# Altium footprint library my_AP_lib_pcb.PcbLib: 115 footprints (part 6 of 8)
Each footprint in its own frame and in the unit in brackets; x right, y up, seen from the top. Pads: shape width x height; smd on the part's side, far side on the other; paste and mask are expansions set on the pad; w line width, h text height; cw(c..) or ccw(c..) is an arc to the next point about the centre after c.
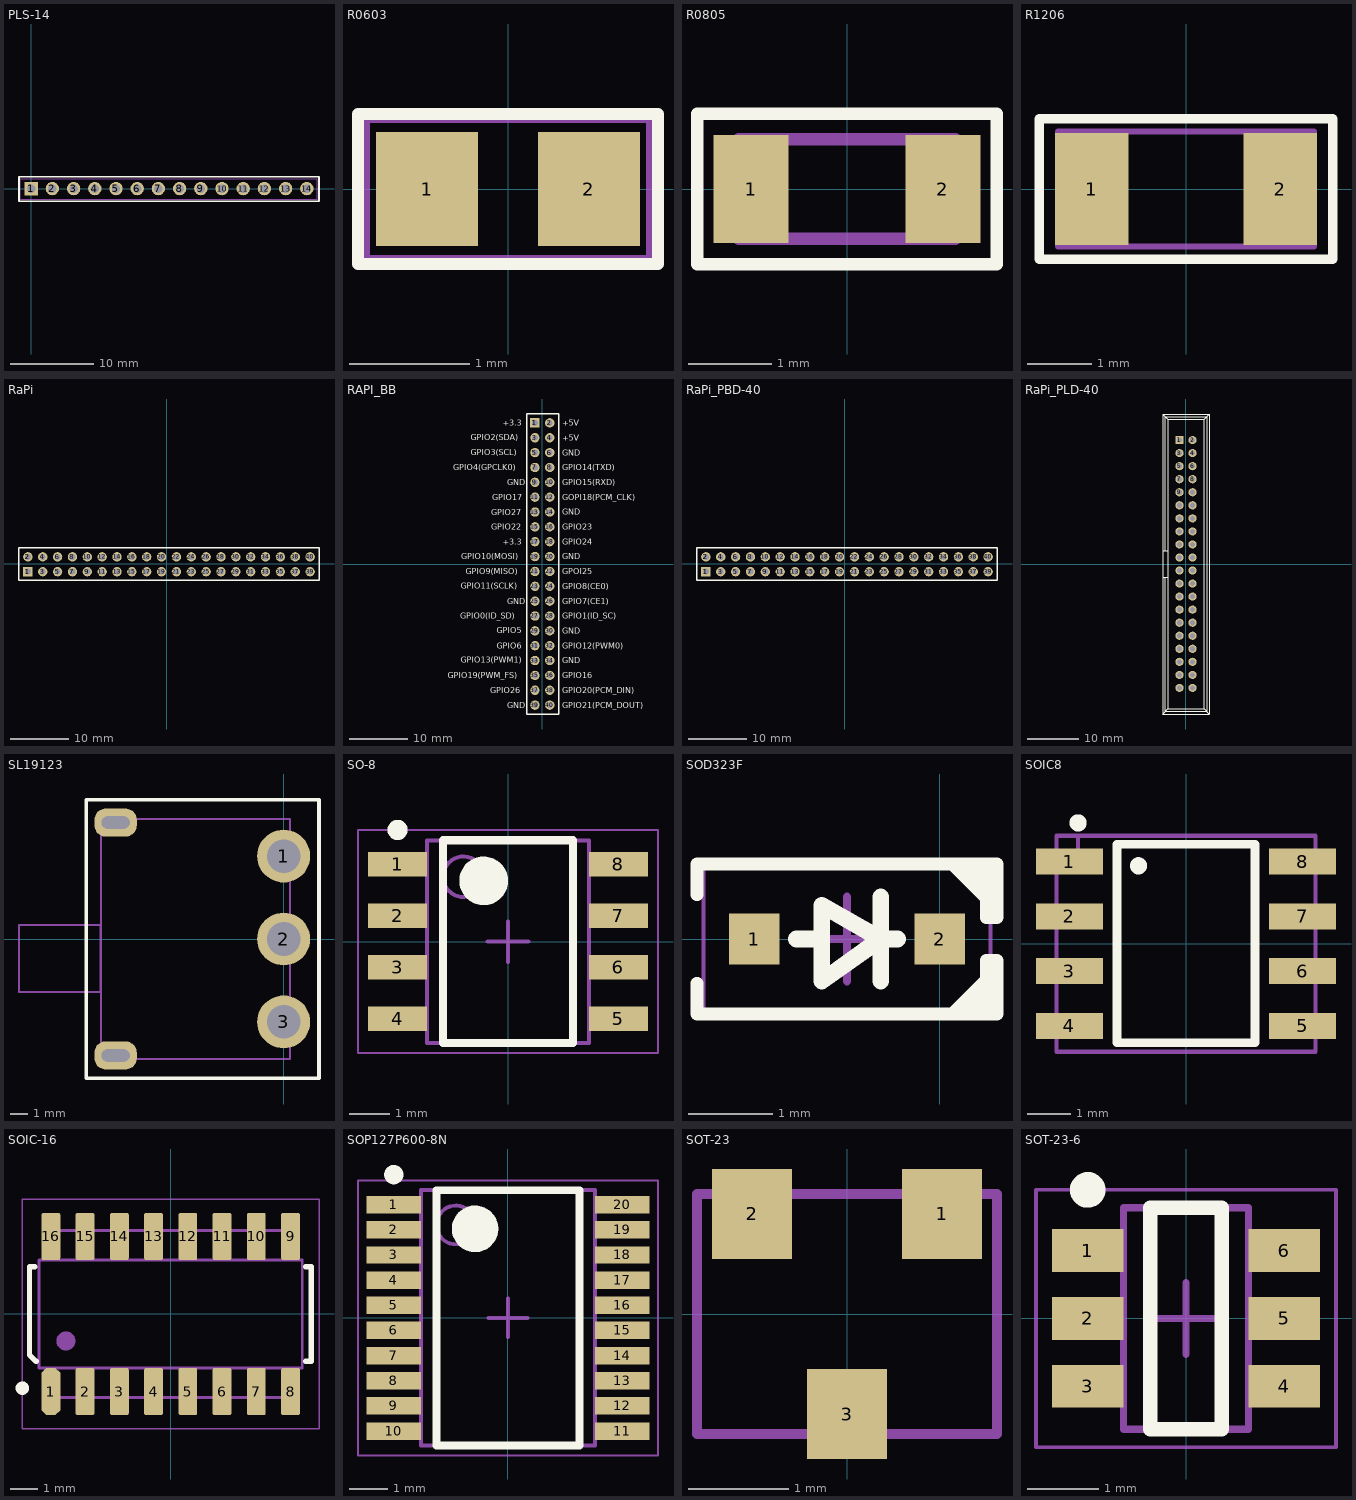
[diagram p5: the footprints below, top view; thin cyan lines are the x and y axes]

## PLS-14 [mm]
pads (14):
  rect 1.6x1.6 hole 1: 1(0,0)
  round 1.6 hole 1: 2(2.54,0) 3(5.08,0) 4(7.62,0) 5(10.16,0) 6(12.7,0) 7(15.24,0) 8(17.78,0) 9(20.32,0) 10(22.86,0) 11(25.4,0) 12(27.94,0) 13(30.48,0) 14(33.02,0)
Top Overlay:
  lines w0.2: -1.46,-1.5 34.48,-1.5 34.48,1.4 -1.46,1.4 -1.46,-1.5
Mechanical 15:
  lines w0.1: -1.29,-1.3 -1.29,1.2 34.29,1.2 34.29,-1.3 -1.29,-1.3
3D body "User Library-PLS-6-1.step": height 8.54, standoff -3, extent -1.27,-1.27 13.97,1.27
3D body "User Library-PLS-6-1.step": height 8.54, standoff -3, extent 13.97,-1.27 29.21,1.27
3D body "User Library-PLS-6-1.step": height 8.54, standoff -3, extent 19.05,-1.27 34.29,1.27

## R0603 [mm]
pads (2):
  rect 0.85x0.95 smd: 1(-0.675,0) 2(0.675,0)
Top Overlay:
  lines w0.1: -1.25,-0.625 1.25,-0.625 1.25,0.625 -1.25,0.625 -1.25,-0.625
Mechanical 15:
  lines w0.1: -1.2,-0.6 1.2,-0.6 1.2,0.6 -1.2,0.6 -1.2,-0.6
  text ".Designator" at -0.9,-0.1 h0.3
3D body "RES0603.step": height 0.45, standoff 0, extent -0.8,-0.4 0.8,0.4

## R0805 [mm]
height 1.45
pads (2):
  rect 0.9x1.3 smd: 1(-1.15,0) 2(1.15,0)
Top Overlay:
  lines w0.15: -1.8,-0.9 -1.8,0.9 1.8,0.9 1.8,-0.9 -1.8,-0.9
Mechanical 15:
  lines w0.15: -1.3,-0.6 1.3,-0.6 1.3,0.6 -1.3,0.6 -1.3,-0.6
  text ".Designator" at -0.9,-0.1 h0.3
3D body "User Library-User Library-0805_Res1.step": height 0.8, standoff 0, extent -1.4,-0.625 1.4,0.625

## R1206 [mm]
pads (2):
  rect 1.15x1.75 smd: 1(-1.475,0) 2(1.475,0)
Top Overlay:
  lines w0.15: -2.3,-1.1 2.3,-1.1 2.3,1.1 -2.3,1.1 -2.3,-1.1
Mechanical 15:
  lines w0.1: -2,-0.9 -2,0.9 2,0.9 2,-0.9 -2,-0.9
  text ".Designator" at -1.7,-0.1 h0.5
3D body "RES1206-2.step": height 0.55, standoff 0, extent -1.505,-0.775 1.505,0.775

## RaPi [mm]
pads (42):
  round 1.6 hole 1.02 mask+0.05: 1(-23.78,-1.32) 2(-23.78,1.22) 2(-23.78,1.22) 3(-21.24,-1.32) 4(-21.24,1.22) 5(-18.7,-1.32) 6(-18.7,1.22) 7(-16.16,-1.32) 8(-16.16,1.22) 9(-13.62,-1.32) 10(-13.62,1.22) 11(-11.08,-1.32) 12(-11.08,1.22) 13(-8.54,-1.32) 14(-8.54,1.22) 15(-6,-1.32) 16(-6,1.22) 17(-3.46,-1.32) 18(-3.46,1.22) 19(-0.92,-1.32) 20(-0.92,1.22) 21(1.62,-1.32) 22(1.62,1.22) 23(4.16,-1.32) 24(4.16,1.22) 25(6.7,-1.32) 26(6.7,1.22) 27(9.24,-1.32) 28(9.24,1.22) 29(11.78,-1.32) 30(11.78,1.22) 31(14.32,-1.32) 32(14.32,1.22) 33(16.86,-1.32) 34(16.86,1.22) 35(19.4,-1.32) 36(19.4,1.22) 37(21.94,-1.32) 38(21.94,1.22) 39(24.48,-1.32) 40(24.48,1.22)
  rect 1.6x1.6 hole 1.02 mask+0.05: 1(-23.78,-1.32)
Top Overlay:
  lines w0.254: -25.3,-2.75 -25.3,2.75 26,2.75 26,-2.75 -25.3,-2.75
3D body "User Library-Raspberry-Pi-4-Model-B-03.STEP": height 4.69, standoff -14.94, extent -32,-54.3 55.94,3.6
3D body "User Library-PBD2_54-40.step": height 2.7, standoff -8.4, extent -25.075,-2.5 25.725,2.58

## RAPI_BB [mm]
pads (41):
  round 1.6 hole 1.02 mask+0.05: 1(-1.27,24.13) 2(1.27,24.13) 3(-1.27,21.59) 4(1.27,21.59) 5(-1.27,19.05) 6(1.27,19.05) 7(-1.27,16.51) 8(1.27,16.51) 9(-1.27,13.97) 10(1.27,13.97) 11(-1.27,11.43) 12(1.27,11.43) 13(-1.27,8.89) 14(1.27,8.89) 15(-1.27,6.35) 16(1.27,6.35) 17(-1.27,3.81) 18(1.27,3.81) 19(-1.27,1.27) 20(1.27,1.27) 21(-1.27,-1.27) 22(1.27,-1.27) 23(-1.27,-3.81) 24(1.27,-3.81) 25(-1.27,-6.35) 26(1.27,-6.35) 27(-1.27,-8.89) 28(1.27,-8.89) 29(-1.27,-11.43) 30(1.27,-11.43) 31(-1.27,-13.97) 32(1.27,-13.97) 33(-1.27,-16.51) 34(1.27,-16.51) 35(-1.27,-19.05) 36(1.27,-19.05) 37(-1.27,-21.59) 38(1.27,-21.59) 39(-1.27,-24.13) 40(1.27,-24.13)
  rect 1.6x1.6 hole 1.02 mask+0.05: 1(-1.27,24.13)
Top Overlay:
  lines w0.254: -2.7,-25.65 2.8,-25.65 2.8,25.65 -2.7,25.65 -2.7,-25.65
  text "+3.3" at -6.77,23.63 h1
  text "+5V" at 3.43,23.63 h1
  text "+5V" at 3.43,21.09 h1
  text "GND" at 3.43,18.55 h1
  text "GPIO14(TXD)" at 3.43,16.01 h1
  text "GPIO15(RXD)" at 3.43,13.47 h1
  text "GOPI18(PCM_CLK)" at 3.43,10.93 h1
  text "GND" at 3.43,8.39 h1
  text "GPIO23" at 3.43,5.85 h1
  text "GPIO24" at 3.43,3.31 h1
  text "GND" at 3.43,0.77 h1
  text "GPOI25" at 3.43,-1.77 h1
  text "GPIO8(CE0)" at 3.43,-4.31 h1
  text "GPIO7(CE1)" at 3.43,-6.85 h1
  text "GPIO1(ID_SC)" at 3.43,-9.39 h1
  text "GND" at 3.43,-11.93 h1
  text "GPIO12(PWM0)" at 3.43,-14.47 h1
  text "GND" at 3.43,-17.01 h1
  text "GPIO16" at 3.43,-19.55 h1
  text "GPIO20(PCM_DIN)" at 3.43,-22.09 h1
  text "GPIO21(PCM_DOUT)" at 3.43,-24.63 h1
  text "GPIO2(SDA)" at -12.27,21.13 h1
  text "GPIO3(SCL)" at -12.27,18.63 h1
  text "GPIO4(GPCLK0)" at -15.27,16.03 h1
  text "GND" at -5.97,13.43 h1
  text "GPIO17" at -8.57,10.93 h1
  text "GPIO27" at -8.77,8.33 h1
  text "GPIO22" at -8.77,5.83 h1
  text "+3.3" at -6.77,3.33 h1
  text "GPIO10(MOSI)" at -13.87,0.83 h1
  text "GPIO9(MISO)" at -13.07,-1.77 h1
  text "GPIO11(SCLK)" at -13.97,-4.27 h1
  text "GND" at -5.97,-6.87 h1
  text "GPIO0(ID_SD)" at -14.07,-9.37 h1
  text "GPIO5" at -7.77,-11.87 h1
  text "GPIO6" at -7.77,-14.47 h1
  text "GPIO13(PWM1)" at -13.97,-16.87 h1
  text "GPIO19(PWM_FS)" at -16.17,-19.57 h1
  text "GPIO26" at -8.87,-22.07 h1
  text "GND" at -5.97,-24.63 h1
3D body "User Library-PBD2_54-40.step": height 8.4, standoff -2.7, extent -2.5,-25.4 2.58,25.4

## RaPi_PBD-40 [mm]
pads (42):
  round 1.6 hole 1.02 mask+0.05: 1(-23.78,-1.32) 2(-23.78,1.22) 2(-23.78,1.22) 3(-21.24,-1.32) 4(-21.24,1.22) 5(-18.7,-1.32) 6(-18.7,1.22) 7(-16.16,-1.32) 8(-16.16,1.22) 9(-13.62,-1.32) 10(-13.62,1.22) 11(-11.08,-1.32) 12(-11.08,1.22) 13(-8.54,-1.32) 14(-8.54,1.22) 15(-6,-1.32) 16(-6,1.22) 17(-3.46,-1.32) 18(-3.46,1.22) 19(-0.92,-1.32) 20(-0.92,1.22) 21(1.62,-1.32) 22(1.62,1.22) 23(4.16,-1.32) 24(4.16,1.22) 25(6.7,-1.32) 26(6.7,1.22) 27(9.24,-1.32) 28(9.24,1.22) 29(11.78,-1.32) 30(11.78,1.22) 31(14.32,-1.32) 32(14.32,1.22) 33(16.86,-1.32) 34(16.86,1.22) 35(19.4,-1.32) 36(19.4,1.22) 37(21.94,-1.32) 38(21.94,1.22) 39(24.48,-1.32) 40(24.48,1.22)
  rect 1.6x1.6 hole 1.02 mask+0.05: 1(-23.78,-1.32)
Top Overlay:
  lines w0.254: -25.3,-2.75 -25.3,2.75 26,2.75 26,-2.75 -25.3,-2.75
3D body "User Library-PBD2_54-40.step": height 8.4, standoff -2.7, extent -25.075,-2.5 25.725,2.58

## RaPi_PLD-40 [mm]
pads (40):
  rect 1.6x1.6 hole 1 mask+0.05: 1(-1.27,24.13)
  round 1.6 hole 1 mask+0.05: 2(1.27,24.13) 3(-1.27,21.59) 4(1.27,21.59) 5(-1.27,19.05) 6(1.27,19.05) 7(-1.27,16.51) 8(1.27,16.51) 9(-1.27,13.97) 10(1.27,13.97) 11(-1.27,11.43) 12(1.27,11.43) 13(-1.27,8.89) 14(1.27,8.89) 15(-1.27,6.35) 16(1.27,6.35) 17(-1.27,3.81) 18(1.27,3.81) 19(-1.27,1.27) 20(1.27,1.27) 21(-1.27,-1.27) 22(1.27,-1.27) 23(-1.27,-3.81) 24(1.27,-3.81) 25(-1.27,-6.35) 26(1.27,-6.35) 27(-1.27,-8.89) 28(1.27,-8.89) 29(-1.27,-11.43) 30(1.27,-11.43) 31(-1.27,-13.97) 32(1.27,-13.97) 33(-1.27,-16.51) 34(1.27,-16.51) 35(-1.27,-19.05) 36(1.27,-19.05) 37(-1.27,-21.59) 38(1.27,-21.59) 39(-1.27,-24.13) 40(1.27,-24.13)
Top Overlay:
  lines w0.127: -4.572,-2.54 -3.556,-2.54 ; -4.572,2.54 -3.556,2.54 ; -4.064,-2.54 -4.064,-28.702 4.064,-28.702 4.064,28.702 -4.064,28.702 -4.064,2.54 ; -4.572,-29.21 4.572,-29.21 ; -4.572,-29.21 -3.556,-28.194 ; -4.572,-29.21 -4.572,29.21 ; -4.572,29.21 4.572,29.21 ; -4.572,29.21 -3.556,28.194 ; -3.556,-28.194 3.556,-28.194 ; -3.556,-28.194 -3.556,28.194 ; -3.556,28.194 3.556,28.194 ; 3.556,-28.194 3.556,28.194 ; 3.556,-28.194 4.572,-29.21 ; 3.556,28.194 3.556,28.194 ; 3.556,28.194 4.572,29.21 ; 4.572,-29.21 4.572,29.21
3D body "PLS-4.STEP": height 9.2, standoff -3.5, extent -2.54,15.24 0,25.4
3D body "PLS-4.STEP": height 9.2, standoff -3.5, extent 0,15.24 2.54,25.4
3D body "PLS-4.STEP": height 9.2, standoff -3.5, extent -2.54,5.08 0,15.24
3D body "PLS-4.STEP": height 9.2, standoff -3.5, extent 0,5.08 2.54,15.24
3D body "PLS-4.STEP": height 9.2, standoff -3.5, extent -2.54,-5.08 0,5.08
3D body "PLS-4.STEP": height 9.2, standoff -3.5, extent 0,-5.08 2.54,5.08
3D body "PLS-4.STEP": height 9.2, standoff -3.5, extent -2.54,-15.24 0,-5.08
3D body "PLS-4.STEP": height 9.2, standoff -3.5, extent 0,-15.24 2.54,-5.08
3D body "PLS-4.STEP": height 9.2, standoff -3.5, extent -2.54,-25.4 0,-15.24
3D body "PLS-4.STEP": height 9.2, standoff -3.5, extent 0,-25.4 2.54,-15.24

## SL19123 [mm] "swtich"
pads (5):
  round 3 hole 1.9: 1(0,4.7) 2(0,0) 3(0,-4.7)
  rrect80% 2.4x1.6 hole 0.7 slot 1.6 at 0 deg: ""(-9.525,-6.6) ""(-9.525,6.6)
Top Overlay:
  lines w0.2: -11.2,-7.9 2,-7.9 2,7.9 -11.2,7.9 -11.2,-7.9
Mechanical 3:
  lines w0.1: -15,-3 -15,0.8 -10.4,0.8 -10.4,-3 -15,-3 ; -10.35,-6.8 -10.35,6.8 0.35,6.8 0.35,-6.8 -10.35,-6.8

## SO-8 [mm] "SOP, 8-Leads, Body 4,90x3,90mm, Pitch 1,27mm, IPC Medium Density"
height 1.75
pads (8):
  rect 1.45x0.6 smd: 1(-2.725,1.905) 2(-2.725,0.635) 3(-2.725,-0.635) 4(-2.725,-1.905) 5(2.725,-1.905) 6(2.725,-0.635) 7(2.725,0.635) 8(2.725,1.905)
Top Overlay:
  circle w0.6: c-0.6,1.5 r0.3
  circle w0.25: c-2.725,2.755 r0.125
  lines w0.2: -1.6,-2.5 1.6,-2.5 1.6,2.5 -1.6,2.5 -1.6,-2.5
Mechanical 13:
  circle w0.1: c-1.1,1.6 r0.5
  lines w0.1: -2,-2.5 2,-2.5 2,2.5 -2,2.5 -2,-2.5
Mechanical 15:
  lines w0.05: -3.7,-2.75 3.7,-2.75 3.7,2.75 -3.7,2.75 -3.7,-2.75
  lines w0.1: -0.5,0 0.5,0 ; 0,-0.5 0,0.5
3D body "User Library-so8-4.step": height 1.68, standoff -0.09, extent -3.068,-2.445 3.068,2.445

## SOD323F [mm] "SODFL, 2-Leads, Body 1.25x2.50mm, IPC Medium Density"
height 0.8
pads (2):
  rect 0.6x0.6 smd: 1(-2.2,0) 2(0,0)
Top Overlay:
  region: 0.678,-0.254 0.1,-0.832 0.1,-0.9 0.667,-0.9 0.678,-0.889
  region: 0.678,0.254 0.1,0.832 0.1,0.9 0.667,0.9 0.678,0.889
  lines w0.15: -2.878,-0.525 -2.878,-0.889 0.678,-0.889 0.678,-0.254 0.551,-0.254 0.551,-0.889 ; -2.878,0.525 -2.878,0.889 0.678,0.889 0.678,0.254 0.551,0.254 0.551,0.889
  lines w0.2: -1.7,0 -1.4,0 ; -0.7,-0.5 -0.7,0.5 ; -0.5,0 -0.7,0 ; -0.7,0 -1.4,0.4 -1.4,-0.5 -0.7,0
Mechanical 15:
  lines w0.05: -2.8,-0.85 -2.8,0.85 0.6,0.85 0.6,-0.85 -2.8,-0.85
  lines w0.1: -1.6,0 -0.6,0 ; -1.1,-0.5 -1.1,0.5
3D body "SOD323F.STEP": height 0.8, standoff 0, extent -2.35,-0.625 0.15,0.625

## SOIC8 [mm]
pads (8):
  rect 1.55x0.6 smd: 1(-2.7,1.905) 2(-2.7,0.635) 3(-2.7,-0.635) 4(-2.7,-1.905) 5(2.7,-1.905) 6(2.7,-0.635) 7(2.7,0.635) 8(2.7,1.905)
Top Layer:
  region: -2.7,1.905
Top Overlay:
  circle w0.2: c-2.5,2.8 r0.1
  circle w0.2: c-1.1,1.805 r0.1
  lines w0.2: -1.6,-2.295 -1.6,2.305 1.6,2.305 1.6,-2.295 -1.6,-2.295
Mechanical 15:
  lines w0.1: -3,2 -2.5,2 -2.5,2.5 ; -3,-2.5 -3,2.5 3,2.5 3,-2.5 -3,-2.5
  text ".Designator" at -2.1,-0.195 h0.5
3D body "SOIC-8-1.step": height 1.75, standoff 0, extent -3,-2.45 3,2.45

## SOIC-16 [mm]
height 1.75
pads (16):
  oct 0.7x1.75 smd mask+0.05: 1(-4.445,-2.875)
  rrect20% 0.7x1.75 smd mask+0.05: 2(-3.175,-2.875) 3(-1.905,-2.875) 4(-0.635,-2.875) 5(0.635,-2.875) 6(1.905,-2.875) 7(3.175,-2.875) 8(4.445,-2.875) 9(4.445,2.875) 10(3.175,2.875) 11(1.905,2.875) 12(0.635,2.875) 13(-0.635,2.875) 14(-1.905,2.875) 15(-3.175,2.875) 16(-4.445,2.875)
Top Overlay:
  circle w0.25: c-5.5,-2.75 r0.125
  lines w0.2: -5.035,1.75 -5.235,1.75 -5.235,-1.515 -4.992,-1.757 ; 5.015,-1.75 5.215,-1.75 5.215,1.75 5.015,1.75
Mechanical 5:
  circle w0.5: c-3.885,-1 r0.1
  lines w0.1: -4.635,-2 -4.635,-3.1 4.625,-3.1 4.625,-2 ; -4.625,2 -4.625,3.1 4.625,3.1 4.625,2 ; -4.885,-2 -4.885,2 4.875,2 4.875,-2 -4.885,-2
  text ".Designator" at -2.885,-0.75 h3
Mechanical 9:
  lines w0.05: -5.5,-4.25 -5.5,4.25 5.5,4.25 5.5,-4.25 -5.5,-4.25
3D body "User Library-SOIC-16-2.step": height 1.75, standoff 0, extent -5,-3 5,3

## SOP127P600-8N [mm]
height 1.1
pads (20):
  rect 1.4x0.45 smd: 1(-2.95,2.925) 2(-2.95,2.275) 3(-2.95,1.625) 4(-2.95,0.975) 5(-2.95,0.325) 6(-2.95,-0.325) 7(-2.95,-0.975) 8(-2.95,-1.625) 9(-2.95,-2.275) 10(-2.95,-2.925) 11(2.95,-2.925) 12(2.95,-2.275) 13(2.95,-1.625) 14(2.95,-0.975) 15(2.95,-0.325) 16(2.95,0.325) 17(2.95,0.975) 18(2.95,1.625) 19(2.95,2.275) 20(2.95,2.925)
Top Overlay:
  circle w0.25: c-2.95,3.7 r0.125
  circle w0.6: c-0.85,2.3 r0.3
  lines w0.2: -1.85,-3.3 -1.85,3.3 1.85,3.3 1.85,-3.3 -1.85,-3.3
Mechanical 13:
  circle w0.1: c-1.35,2.4 r0.5
  lines w0.1: -2.25,-3.3 -2.25,3.3 2.25,3.3 2.25,-3.3 -2.25,-3.3
Mechanical 15:
  lines w0.05: -3.875,-3.55 -3.875,3.55 3.875,3.55 3.875,-3.55 -3.875,-3.55
  lines w0.1: -0.5,0 0.5,0 ; 0,-0.5 0,0.5
3D body "User Library-TSSOP-20-2.STEP": height 1.2, standoff 0, extent -3.2,-3.25 3.2,3.25

## SOT-23 [mm]
pads (3):
  rect 0.8x0.9 smd: 1(0.95,1) 2(-0.95,1) 3(0,-1)
Mechanical 15:
  lines w0.1: -1.5,-1.2 -1.5,1.2 1.5,1.2 1.5,-1.2 -1.5,-1.2
  text ".Designator" at -1.75,-0.1 h0.5
3D body "SOT-23.stp": height 0.98, standoff 0, extent -1.46,-1.2 1.46,1.2

## SOT-23-6 [mm] "SOT23, 6-Leads, Body 2,95x2,80mm, Pitch 0,95mm, IPC Medium Density"
height 1.18
pads (6):
  rect 1x0.6 smd: 1(-1.375,0.95) 2(-1.375,0) 3(-1.375,-0.95) 4(1.375,-0.95) 5(1.375,0) 6(1.375,0.95)
Top Overlay:
  circle w0.25: c-1.375,1.8 r0.125
  lines w0.2: -0.5,-1.55 0.5,-1.55 0.5,1.55 -0.5,1.55 -0.5,-1.55
Mechanical 13:
  lines w0.1: -0.875,-1.55 -0.875,1.55 0.875,1.55 0.875,-1.55 -0.875,-1.55
Mechanical 15:
  lines w0.05: -2.1,-1.8 -2.1,1.8 2.1,1.8 2.1,-1.8 -2.1,-1.8
  lines w0.1: -0.5,0 0.5,0 ; 0,-0.5 0,0.5
3D body "sot-23-6.stp": height 1.05, standoff -0.06, extent -1.422,-1.461 1.422,1.461